# Altium schematic symbol library Analog Devices Data Converters Digital-to-Analog Converters.SchLib: 2231 symbols (part 95 of 135) (continued)
## AD7547JRZ-REEL (continued)

## AD7547KN
designator U?
Dual 12-Bit LC2MOS Digital-to-Analog Converter with Parallel Loading, 0 to +70 degC, N-24-1, Tube; Generic Part Number: AD7547; Manufacturer: Analog Devices; PartNumber: AD7547KN; # DAC Outputs: 2; Max V+: 16.5V; Op Pwr Diss: 30mW; Resolution (Bits): 12; Settling Time: 1.5µs; Single Supply: Yes; DatasheetVersion: Rev.A; PackageVersion: 071006-A; PackageReference: N-24-1; PackageDescription: 24-Lead Plastic Dual In-Line Package [PDIP] Narrow Body; Supplier 1: Digi-Key; Supplier Part Number 1: AD7547KN-ND; Supplier 2: Mouser; Supplier Part Number 2: 584-AD7547KN; Packing: Tube; RoHS: N; Mounting Technology: Through Hole; Code_JEDEC: MS-001; ComponentLink1Description: Manufacturer URL; ComponentLink1URL: http://www.analog.com/en/index.html; ComponentLink2Description: Datasheet; ComponentLink2URL: http://www.analog.com/static/imported-files/data_sheets/AD7547.pdf; ComponentLink3Description: Package Specification; ComponentLink3URL: http://www.analog.com/static/imported-files/packages/50726455539629N_24_1.pdf; ComponentLink4Description: Product URL; ComponentLink4URL: http://www.analog.com/en/digital-to-analog-converters/da-converters/ad7547/products/product.html
footprint N-24-1 (DIP, 24-Leads, Row Spacing 7.62mm, Pitch 2.54mm, Body 31.9x6.6mm)
pins: 1 AGND (power) "Analog Ground.", 2 IOUTA (out) "Current output terminal of DACA.", 3 RFBA (in) "Feedback resistor for DACA.", 4 VREFA (in) "Reference input to DACA.", 5 ~{CSA} (in) "Chip Select Input for DACA. Active low.", 6 DB0(LSB) (in) "Data input.", 7 DB1 (in) "Data input.", 8 DB2 (in) "Data input.", 9 DB3 (in) "Data input.", 10 DB4 (in) "Data input.", 11 DB5 (in) "Data input.", 12 DGND (power) "Digital Ground.", 13 DB6 (in) "Data input.", 14 DB7 (in) "Data input.", 15 DB8 (in) "Data input.", 16 DB9 (in) "Data input.", 17 DB10 (in) "Data input.", 18 DB11(MSB) (in) "Data input.", 19 ~{WR} (in) "Write Input. Data transfer occurs on rising edge of W\R\. See Table I.", 20 ~{CSB} (in) "Chip Select Input for DACB. Active low.", 21 VDD (power) "Power supply input. Norminally +12V to +15V with + / - 10% tolerance.", 22 VREFB (in) "Reference input to DACB.", 23 RFBB (in) "Feedback resistor of DACB.", 24 IOUTB (out) "Current output terminal of DACB."

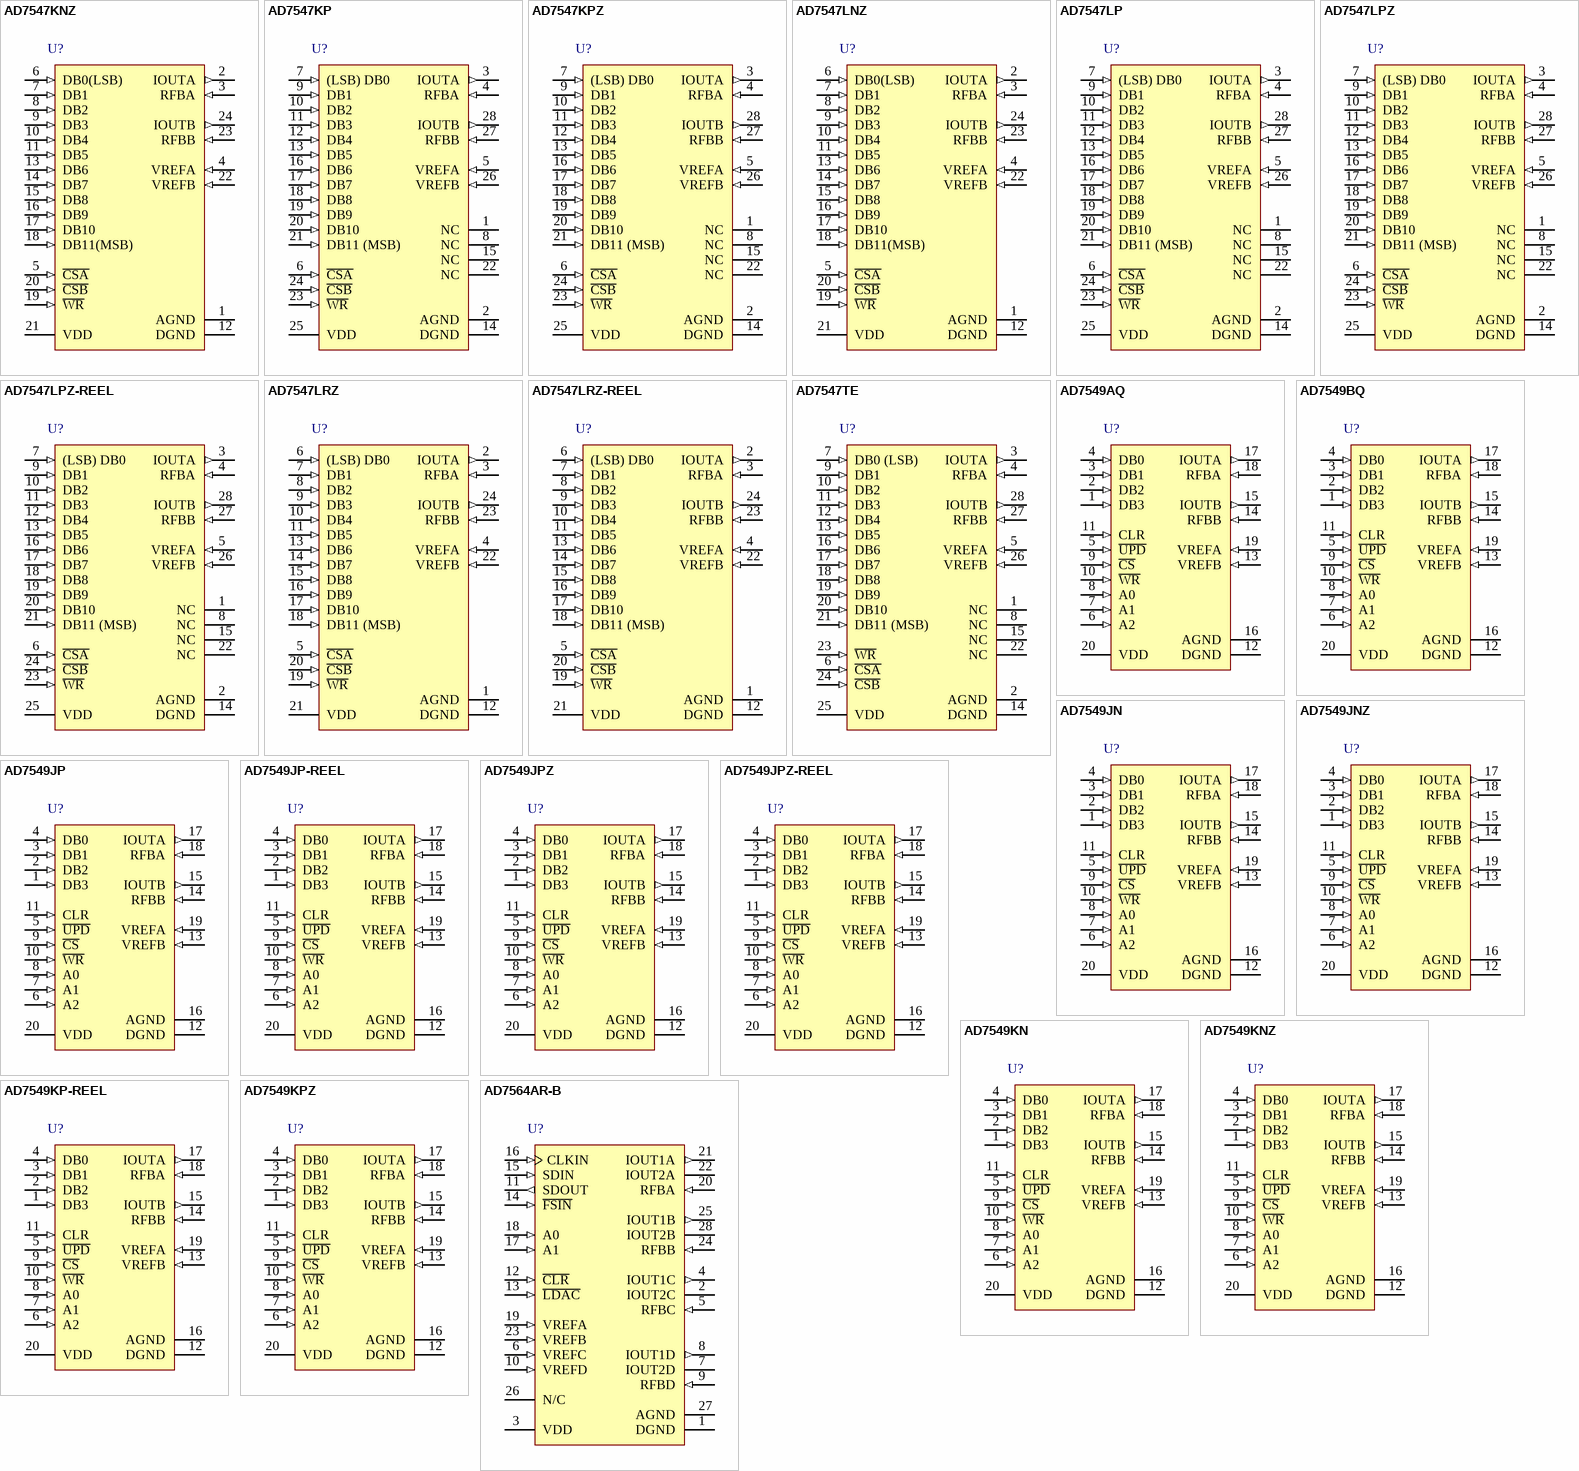
[diagram p70: symbols AD7547KNZ to AD7564AR-B]

## AD7547KNZ
designator U?
Dual 12-Bit LC2MOS Digital-to-Analog Converter with Parallel Loading, 0 to +70 degC, N-24-1, Pb-Free, Tube; Generic Part Number: AD7547; Manufacturer: Analog Devices; PartNumber: AD7547KNZ; # DAC Outputs: 2; Max V+: 16.5V; Op Pwr Diss: 30mW; Resolution (Bits): 12; Settling Time: 1.5µs; Single Supply: Yes; DatasheetVersion: Rev.A; PackageVersion: 071006-A; PackageReference: N-24-1; PackageDescription: 24-Lead Plastic Dual In-Line Package [PDIP] Narrow Body; Supplier 1: Digi-Key; Supplier Part Number 1: AD7547KNZ-ND; Supplier 2: Newark; Supplier Part Number 2: 59K5033; Supplier 3: Mouser; Supplier Part Number 3: 584-AD7547KNZ; Packing: Tube; RoHS: Y; Mounting Technology: Through Hole; Code_JEDEC: MS-001; ComponentLink1Description: Manufacturer URL; ComponentLink1URL: http://www.analog.com/en/index.html; ComponentLink2Description: Datasheet; ComponentLink2URL: http://www.analog.com/static/imported-files/data_sheets/AD7547.pdf; ComponentLink3Description: Package Specification; ComponentLink3URL: http://www.analog.com/static/imported-files/packages/50726455539629N_24_1.pdf; ComponentLink4Description: Product URL; ComponentLink4URL: http://www.analog.com/en/digital-to-analog-converters/da-converters/ad7547/products/product.html
footprint N-24-1 (DIP, 24-Leads, Row Spacing 7.62mm, Pitch 2.54mm, Body 31.9x6.6mm)
pins: 1 AGND (power) "Analog Ground.", 2 IOUTA (out) "Current output terminal of DACA.", 3 RFBA (in) "Feedback resistor for DACA.", 4 VREFA (in) "Reference input to DACA.", 5 ~{CSA} (in) "Chip Select Input for DACA. Active low.", 6 DB0(LSB) (in) "Data input.", 7 DB1 (in) "Data input.", 8 DB2 (in) "Data input.", 9 DB3 (in) "Data input.", 10 DB4 (in) "Data input.", 11 DB5 (in) "Data input.", 12 DGND (power) "Digital Ground.", 13 DB6 (in) "Data input.", 14 DB7 (in) "Data input.", 15 DB8 (in) "Data input.", 16 DB9 (in) "Data input.", 17 DB10 (in) "Data input.", 18 DB11(MSB) (in) "Data input.", 19 ~{WR} (in) "Write Input. Data transfer occurs on rising edge of W\R\. See Table I.", 20 ~{CSB} (in) "Chip Select Input for DACB. Active low.", 21 VDD (power) "Power supply input. Norminally +12V to +15V with + / - 10% tolerance.", 22 VREFB (in) "Reference input to DACB.", 23 RFBB (in) "Feedback resistor of DACB.", 24 IOUTB (out) "Current output terminal of DACB."

## AD7547KP
designator U?
Dual 12-Bit LC2MOS Digital-to-Analog Converter with Parallel Loading, 0 to +70 degC, P-28, Tube; Generic Part Number: AD7547; Manufacturer: Analog Devices; PartNumber: AD7547KP; # DAC Outputs: 2; Max V+: 16.5V; Op Pwr Diss: 30mW; Resolution (Bits): 12; Settling Time: 1.5µs; Single Supply: Yes; DatasheetVersion: Rev.A; PackageVersion: 042508-A; PackageReference: P-28; PackageDescription: 28-Lead Plastic Leaded Chip Carrier [PLCC]; Supplier 1: Digi-Key; Supplier Part Number 1: AD7547KP-ND; Supplier 2: Mouser; Supplier Part Number 2: 584-AD7547KP; Packing: Tube; RoHS: N; Mounting Technology: Surface Mount; Code_JEDEC: MO-047-AB; ComponentLink1Description: Manufacturer URL; ComponentLink1URL: http://www.analog.com/en/index.html; ComponentLink2Description: Datasheet; ComponentLink2URL: http://www.analog.com/static/imported-files/data_sheets/AD7547.pdf; ComponentLink3Description: Package Specification; ComponentLink3URL: http://www.analog.com/static/imported-files/packages/PKG_PDF/PLCC(P)/P_28.pdf; ComponentLink4Description: Product URL; ComponentLink4URL: http://www.analog.com/en/digital-to-analog-converters/da-converters/ad7547/products/product.html
footprint P-28_N (Leaded Chip Carrier, 28-Leads, Body 11.5x11.5mm, Pitch 1.27mm, IPC Medium Density)
footprint P-28_L (Leaded Chip Carrier, 28-Leads, Body 11.5x11.5mm, Pitch 1.27mm, IPC High Density)
footprint P-28_M (Leaded Chip Carrier, 28-Leads, Body 11.5x11.5mm, Pitch 1.27mm, IPC Low Density)
pins: 1 NC, 2 AGND (power), 3 IOUTA (out), 4 RFBA (in), 5 VREFA (in), 6 ~{CSA} (in), 7 (LSB) DB0 (in), 8 NC, 9 DB1 (in), 10 DB2 (in), 11 DB3 (in), 12 DB4 (in), 13 DB5 (in), 14 DGND (power), 15 NC, 16 DB6 (in), 17 DB7 (in), 18 DB8 (in), 19 DB9 (in), 20 DB10 (in), 21 DB11 (MSB) (in), 22 NC, 23 ~{WR} (in), 24 ~{CSB} (in), 25 VDD (power), 26 VREFB (in), 27 RFBB (in), 28 IOUTB (out)

## AD7547KPZ
designator U?
Dual 12-Bit LC2MOS Digital-to-Analog Converter with Parallel Loading, 0 to +70 degC, P-28, Pb-Free, Tube; Generic Part Number: AD7547; Manufacturer: Analog Devices; PartNumber: AD7547KPZ; # DAC Outputs: 2; Max V+: 16.5V; Op Pwr Diss: 30mW; Resolution (Bits): 12; Settling Time: 1.5µs; Single Supply: Yes; DatasheetVersion: Rev.A; PackageVersion: 042508-A; PackageReference: P-28; PackageDescription: 28-Lead Plastic Leaded Chip Carrier [PLCC]; Supplier 1: Digi-Key; Supplier Part Number 1: AD7547KPZ-ND; Supplier 2: Mouser; Supplier Part Number 2: 584-AD7547KPZ; Packing: Tube; RoHS: Y; Mounting Technology: Surface Mount; Code_JEDEC: MO-047-AB; ComponentLink1Description: Manufacturer URL; ComponentLink1URL: http://www.analog.com/en/index.html; ComponentLink2Description: Datasheet; ComponentLink2URL: http://www.analog.com/static/imported-files/data_sheets/AD7547.pdf; ComponentLink3Description: Package Specification; ComponentLink3URL: http://www.analog.com/static/imported-files/packages/PKG_PDF/PLCC(P)/P_28.pdf; ComponentLink4Description: Product URL; ComponentLink4URL: http://www.analog.com/en/digital-to-analog-converters/da-converters/ad7547/products/product.html
footprint P-28_N (Leaded Chip Carrier, 28-Leads, Body 11.5x11.5mm, Pitch 1.27mm, IPC Medium Density)
footprint P-28_L (Leaded Chip Carrier, 28-Leads, Body 11.5x11.5mm, Pitch 1.27mm, IPC High Density)
footprint P-28_M (Leaded Chip Carrier, 28-Leads, Body 11.5x11.5mm, Pitch 1.27mm, IPC Low Density)
pins: 1 NC, 2 AGND (power), 3 IOUTA (out), 4 RFBA (in), 5 VREFA (in), 6 ~{CSA} (in), 7 (LSB) DB0 (in), 8 NC, 9 DB1 (in), 10 DB2 (in), 11 DB3 (in), 12 DB4 (in), 13 DB5 (in), 14 DGND (power), 15 NC, 16 DB6 (in), 17 DB7 (in), 18 DB8 (in), 19 DB9 (in), 20 DB10 (in), 21 DB11 (MSB) (in), 22 NC, 23 ~{WR} (in), 24 ~{CSB} (in), 25 VDD (power), 26 VREFB (in), 27 RFBB (in), 28 IOUTB (out)

## AD7547LNZ
designator U?
Dual 12-Bit LC2MOS Digital-to-Analog Converter with Parallel Loading, 0 to +70 degC, N-24-1, Pb-Free, Tube; Generic Part Number: AD7547; Manufacturer: Analog Devices; PartNumber: AD7547LNZ; # DAC Outputs: 2; Max V+: 16.5V; Op Pwr Diss: 30mW; Resolution (Bits): 12; Settling Time: 1.5µs; Single Supply: Yes; DatasheetVersion: Rev.A; PackageVersion: 071006-A; PackageReference: N-24-1; PackageDescription: 24-Lead Plastic Dual In-Line Package [PDIP] Narrow Body; Supplier 1: Digi-Key; Supplier Part Number 1: AD7547LNZ-ND; Supplier 2: Mouser; Supplier Part Number 2: 584-AD7547LNZ; Packing: Tube; RoHS: Y; Mounting Technology: Through Hole; Code_JEDEC: MS-001; ComponentLink1Description: Manufacturer URL; ComponentLink1URL: http://www.analog.com/en/index.html; ComponentLink2Description: Datasheet; ComponentLink2URL: http://www.analog.com/static/imported-files/data_sheets/AD7547.pdf; ComponentLink3Description: Package Specification; ComponentLink3URL: http://www.analog.com/static/imported-files/packages/50726455539629N_24_1.pdf; ComponentLink4Description: Product URL; ComponentLink4URL: http://www.analog.com/en/digital-to-analog-converters/da-converters/ad7547/products/product.html
footprint N-24-1 (DIP, 24-Leads, Row Spacing 7.62mm, Pitch 2.54mm, Body 31.9x6.6mm)
pins: 1 AGND (power) "Analog Ground.", 2 IOUTA (out) "Current output terminal of DACA.", 3 RFBA (in) "Feedback resistor for DACA.", 4 VREFA (in) "Reference input to DACA.", 5 ~{CSA} (in) "Chip Select Input for DACA. Active low.", 6 DB0(LSB) (in) "Data input.", 7 DB1 (in) "Data input.", 8 DB2 (in) "Data input.", 9 DB3 (in) "Data input.", 10 DB4 (in) "Data input.", 11 DB5 (in) "Data input.", 12 DGND (power) "Digital Ground.", 13 DB6 (in) "Data input.", 14 DB7 (in) "Data input.", 15 DB8 (in) "Data input.", 16 DB9 (in) "Data input.", 17 DB10 (in) "Data input.", 18 DB11(MSB) (in) "Data input.", 19 ~{WR} (in) "Write Input. Data transfer occurs on rising edge of W\R\. See Table I.", 20 ~{CSB} (in) "Chip Select Input for DACB. Active low.", 21 VDD (power) "Power supply input. Norminally +12V to +15V with + / - 10% tolerance.", 22 VREFB (in) "Reference input to DACB.", 23 RFBB (in) "Feedback resistor of DACB.", 24 IOUTB (out) "Current output terminal of DACB."

## AD7547LP
designator U?
Dual 12-Bit LC2MOS Digital-to-Analog Converter with Parallel Loading, 0 to +70 degC, P-28, Tube; Generic Part Number: AD7547; Manufacturer: Analog Devices; PartNumber: AD7547LP; # DAC Outputs: 2; Max V+: 16.5V; Op Pwr Diss: 30mW; Resolution (Bits): 12; Settling Time: 1.5µs; Single Supply: Yes; DatasheetVersion: Rev.A; PackageVersion: 042508-A; PackageReference: P-28; PackageDescription: 28-Lead Plastic Leaded Chip Carrier [PLCC]; Supplier 1: Digi-Key; Supplier Part Number 1: AD7547LP-ND; Supplier 2: Mouser; Supplier Part Number 2: 584-AD7547LP; Packing: Tube; RoHS: N; Mounting Technology: Surface Mount; Code_JEDEC: MO-047-AB; ComponentLink1Description: Manufacturer URL; ComponentLink1URL: http://www.analog.com/en/index.html; ComponentLink2Description: Datasheet; ComponentLink2URL: http://www.analog.com/static/imported-files/data_sheets/AD7547.pdf; ComponentLink3Description: Package Specification; ComponentLink3URL: http://www.analog.com/static/imported-files/packages/PKG_PDF/PLCC(P)/P_28.pdf; ComponentLink4Description: Product URL; ComponentLink4URL: http://www.analog.com/en/digital-to-analog-converters/da-converters/ad7547/products/product.html
footprint P-28_N (Leaded Chip Carrier, 28-Leads, Body 11.5x11.5mm, Pitch 1.27mm, IPC Medium Density)
footprint P-28_L (Leaded Chip Carrier, 28-Leads, Body 11.5x11.5mm, Pitch 1.27mm, IPC High Density)
footprint P-28_M (Leaded Chip Carrier, 28-Leads, Body 11.5x11.5mm, Pitch 1.27mm, IPC Low Density)
pins: 1 NC, 2 AGND (power), 3 IOUTA (out), 4 RFBA (in), 5 VREFA (in), 6 ~{CSA} (in), 7 (LSB) DB0 (in), 8 NC, 9 DB1 (in), 10 DB2 (in), 11 DB3 (in), 12 DB4 (in), 13 DB5 (in), 14 DGND (power), 15 NC, 16 DB6 (in), 17 DB7 (in), 18 DB8 (in), 19 DB9 (in), 20 DB10 (in), 21 DB11 (MSB) (in), 22 NC, 23 ~{WR} (in), 24 ~{CSB} (in), 25 VDD (power), 26 VREFB (in), 27 RFBB (in), 28 IOUTB (out)

## AD7547LPZ
designator U?
Dual 12-Bit LC2MOS Digital-to-Analog Converter with Parallel Loading, 0 to +70 degC, P-28, Pb-Free, Tube; Generic Part Number: AD7547; Manufacturer: Analog Devices; PartNumber: AD7547LPZ; # DAC Outputs: 2; Max V+: 16.5V; Op Pwr Diss: 30mW; Resolution (Bits): 12; Settling Time: 1.5µs; Single Supply: Yes; DatasheetVersion: Rev.A; PackageVersion: 042508-A; PackageReference: P-28; PackageDescription: 28-Lead Plastic Leaded Chip Carrier [PLCC]; Supplier 1: Digi-Key; Supplier Part Number 1: AD7547LPZ-ND; Supplier 2: Mouser; Supplier Part Number 2: 584-AD7547LPZ; Packing: Tube; RoHS: Y; Mounting Technology: Surface Mount; Code_JEDEC: MO-047-AB; ComponentLink1Description: Manufacturer URL; ComponentLink1URL: http://www.analog.com/en/index.html; ComponentLink2Description: Datasheet; ComponentLink2URL: http://www.analog.com/static/imported-files/data_sheets/AD7547.pdf; ComponentLink3Description: Package Specification; ComponentLink3URL: http://www.analog.com/static/imported-files/packages/PKG_PDF/PLCC(P)/P_28.pdf; ComponentLink4Description: Product URL; ComponentLink4URL: http://www.analog.com/en/digital-to-analog-converters/da-converters/ad7547/products/product.html
footprint P-28_N (Leaded Chip Carrier, 28-Leads, Body 11.5x11.5mm, Pitch 1.27mm, IPC Medium Density)
footprint P-28_L (Leaded Chip Carrier, 28-Leads, Body 11.5x11.5mm, Pitch 1.27mm, IPC High Density)
footprint P-28_M (Leaded Chip Carrier, 28-Leads, Body 11.5x11.5mm, Pitch 1.27mm, IPC Low Density)
pins: 1 NC, 2 AGND (power), 3 IOUTA (out), 4 RFBA (in), 5 VREFA (in), 6 ~{CSA} (in), 7 (LSB) DB0 (in), 8 NC, 9 DB1 (in), 10 DB2 (in), 11 DB3 (in), 12 DB4 (in), 13 DB5 (in), 14 DGND (power), 15 NC, 16 DB6 (in), 17 DB7 (in), 18 DB8 (in), 19 DB9 (in), 20 DB10 (in), 21 DB11 (MSB) (in), 22 NC, 23 ~{WR} (in), 24 ~{CSB} (in), 25 VDD (power), 26 VREFB (in), 27 RFBB (in), 28 IOUTB (out)

## AD7547LPZ-REEL
designator U?
Dual 12-Bit LC2MOS Digital-to-Analog Converter with Parallel Loading, 0 to +70 degC, P-28, Pb-Free, Reel; Generic Part Number: AD7547; Manufacturer: Analog Devices; PartNumber: AD7547LPZ-REEL; # DAC Outputs: 2; Max V+: 16.5V; Op Pwr Diss: 30mW; Resolution (Bits): 12; Settling Time: 1.5µs; Single Supply: Yes; DatasheetVersion: Rev.A; PackageVersion: 042508-A; PackageReference: P-28; PackageDescription: 28-Lead Plastic Leaded Chip Carrier [PLCC]; Supplier 1: Digi-Key; Supplier Part Number 1: AD7547LPZ-REEL-ND; Supplier 2: Mouser; Supplier Part Number 2: 584-AD7547LPZ-R; Packing: Reel; RoHS: Y; Mounting Technology: Surface Mount; Code_JEDEC: MO-047-AB; ComponentLink1Description: Manufacturer URL; ComponentLink1URL: http://www.analog.com/en/index.html; ComponentLink2Description: Datasheet; ComponentLink2URL: http://www.analog.com/static/imported-files/data_sheets/AD7547.pdf; ComponentLink3Description: Package Specification; ComponentLink3URL: http://www.analog.com/static/imported-files/packages/PKG_PDF/PLCC(P)/P_28.pdf; ComponentLink4Description: Product URL; ComponentLink4URL: http://www.analog.com/en/digital-to-analog-converters/da-converters/ad7547/products/product.html
footprint P-28_N (Leaded Chip Carrier, 28-Leads, Body 11.5x11.5mm, Pitch 1.27mm, IPC Medium Density)
footprint P-28_L (Leaded Chip Carrier, 28-Leads, Body 11.5x11.5mm, Pitch 1.27mm, IPC High Density)
footprint P-28_M (Leaded Chip Carrier, 28-Leads, Body 11.5x11.5mm, Pitch 1.27mm, IPC Low Density)
pins: 1 NC, 2 AGND (power), 3 IOUTA (out), 4 RFBA (in), 5 VREFA (in), 6 ~{CSA} (in), 7 (LSB) DB0 (in), 8 NC, 9 DB1 (in), 10 DB2 (in), 11 DB3 (in), 12 DB4 (in), 13 DB5 (in), 14 DGND (power), 15 NC, 16 DB6 (in), 17 DB7 (in), 18 DB8 (in), 19 DB9 (in), 20 DB10 (in), 21 DB11 (MSB) (in), 22 NC, 23 ~{WR} (in), 24 ~{CSB} (in), 25 VDD (power), 26 VREFB (in), 27 RFBB (in), 28 IOUTB (out)

## AD7547LRZ
designator U?
Dual 12-Bit LC2MOS Digital-to-Analog Converter with Parallel Loading, 0 to +70 degC, RW-24, Pb-Free, Tube; Generic Part Number: AD7547; Manufacturer: Analog Devices; PartNumber: AD7547LRZ; # DAC Outputs: 2; Max V+: 16.5V; Op Pwr Diss: 30mW; Resolution (Bits): 12; Settling Time: 1.5µs; Single Supply: Yes; DatasheetVersion: Rev.A; PackageVersion: 060706-A; PackageReference: RW-24; PackageDescription: 24-Lead Standard Small Outline Package [SOIC_W]; Supplier 1: Digi-Key; Supplier Part Number 1: AD7547LRZ-ND; Supplier 2: Mouser; Supplier Part Number 2: 584-AD7547LRZ; Packing: Tube; RoHS: Y; Mounting Technology: Surface Mount; Code_JEDEC: MS-013-AD; ComponentLink1Description: Manufacturer URL; ComponentLink1URL: http://www.analog.com/en/index.html; ComponentLink2Description: Datasheet; ComponentLink2URL: http://www.analog.com/static/imported-files/data_sheets/AD7547.pdf; ComponentLink3Description: Package Specification; ComponentLink3URL: http://www.analog.com/static/imported-files/packages/33665150946139RW_24.pdf; ComponentLink4Description: Product URL; ComponentLink4URL: http://www.analog.com/en/digital-to-analog-converters/da-converters/ad7547/products/product.html
footprint RW-24_N (SOIC, 24-Leads, Body 15.4x7.5mm, Pitch 1.27mm, IPC Medium Density)
footprint RW-24_L (SOIC, 24-Leads, Body 15.4x7.5mm, Pitch 1.27mm, IPC High Density)
footprint RW-24_M (SOIC, 24-Leads, Body 15.4x7.5mm, Pitch 1.27mm, IPC Low Density)
pins: 1 AGND (power) "Analog Ground.", 2 IOUTA (out) "Current output terminal of DACA.", 3 RFBA (in) "Feedback resistor for DACA.", 4 VREFA (in) "Reference input to DACA.", 5 ~{CSA} (in) "Chip Select Input for DACA. Active low.", 6 (LSB) DB0 (in) "Data input.", 7 DB1 (in) "Data input.", 8 DB2 (in) "Data input.", 9 DB3 (in) "Data input.", 10 DB4 (in) "Data input.", 11 DB5 (in) "Data input.", 12 DGND (power) "Digital Ground.", 13 DB6 (in) "Data input.", 14 DB7 (in) "Data input.", 15 DB8 (in) "Data input.", 16 DB9 (in) "Data input.", 17 DB10 (in) "Data input.", 18 DB11 (MSB) (in) "Data input.", 19 ~{WR} (in) "Write Input. Data transfer occurs on rising edge of W\R\. See Table I.", 20 ~{CSB} (in) "Chip Select Input for DACB. Active low.", 21 VDD (power) "Power supply input. Nominally +12V to +15V with + / -10% tolerance.", 22 VREFB (in) "Reference input to DACB.", 23 RFBB (in) "Feedback resistor of DACB.", 24 IOUTB (out) "Current output terminal of DACB."

## AD7547LRZ-REEL
designator U?
Dual 12-Bit LC2MOS Digital-to-Analog Converter with Parallel Loading, 0 to +70 degC, RW-24, Pb-Free, Reel; Generic Part Number: AD7547; Manufacturer: Analog Devices; PartNumber: AD7547LRZ-REEL; # DAC Outputs: 2; Max V+: 16.5V; Op Pwr Diss: 30mW; Resolution (Bits): 12; Settling Time: 1.5µs; Single Supply: Yes; DatasheetVersion: Rev.A; PackageVersion: 060706-A; PackageReference: RW-24; PackageDescription: 24-Lead Standard Small Outline Package [SOIC_W]; Supplier 1: Digi-Key; Supplier Part Number 1: AD7547LRZ-REEL-ND; Supplier 2: Mouser; Supplier Part Number 2: 584-AD7547LRZ-R; Packing: Reel; RoHS: Y; Mounting Technology: Surface Mount; Code_JEDEC: MS-013-AD; ComponentLink1Description: Manufacturer URL; ComponentLink1URL: http://www.analog.com/en/index.html; ComponentLink2Description: Datasheet; ComponentLink2URL: http://www.analog.com/static/imported-files/data_sheets/AD7547.pdf; ComponentLink3Description: Package Specification; ComponentLink3URL: http://www.analog.com/static/imported-files/packages/33665150946139RW_24.pdf; ComponentLink4Description: Product URL; ComponentLink4URL: http://www.analog.com/en/digital-to-analog-converters/da-converters/ad7547/products/product.html
footprint RW-24_N (SOIC, 24-Leads, Body 15.4x7.5mm, Pitch 1.27mm, IPC Medium Density)
footprint RW-24_L (SOIC, 24-Leads, Body 15.4x7.5mm, Pitch 1.27mm, IPC High Density)
footprint RW-24_M (SOIC, 24-Leads, Body 15.4x7.5mm, Pitch 1.27mm, IPC Low Density)
pins: 1 AGND (power) "Analog Ground.", 2 IOUTA (out) "Current output terminal of DACA.", 3 RFBA (in) "Feedback resistor for DACA.", 4 VREFA (in) "Reference input to DACA.", 5 ~{CSA} (in) "Chip Select Input for DACA. Active low.", 6 (LSB) DB0 (in) "Data input.", 7 DB1 (in) "Data input.", 8 DB2 (in) "Data input.", 9 DB3 (in) "Data input.", 10 DB4 (in) "Data input.", 11 DB5 (in) "Data input.", 12 DGND (power) "Digital Ground.", 13 DB6 (in) "Data input.", 14 DB7 (in) "Data input.", 15 DB8 (in) "Data input.", 16 DB9 (in) "Data input.", 17 DB10 (in) "Data input.", 18 DB11 (MSB) (in) "Data input.", 19 ~{WR} (in) "Write Input. Data transfer occurs on rising edge of W\R\. See Table I.", 20 ~{CSB} (in) "Chip Select Input for DACB. Active low.", 21 VDD (power) "Power supply input. Nominally +12V to +15V with + / -10% tolerance.", 22 VREFB (in) "Reference input to DACB.", 23 RFBB (in) "Feedback resistor of DACB.", 24 IOUTB (out) "Current output terminal of DACB."

## AD7547TE
designator U?
Dual 12-Bit LC2MOS Digital-to-Analog Converter with Parallel Loading, -55 to +125 degC, E-28-1, Tube; Generic Part Number: AD7547; Manufacturer: Analog Devices; PartNumber: AD7547TE; # DAC Outputs: 2; Max V+: 16.5V; Op Pwr Diss: 30mW; Resolution (Bits): 12; Settling Time: 1.5µs; Single Supply: Yes; DatasheetVersion: Rev.A; PackageVersion: 022106-A; PackageReference: E-28-1; PackageDescription: 28-Terminal Ceramic Leadless Chip Carrier [LCC]; Supplier 1: Mouser; Supplier Part Number 1: N/A; Packing: Tube; RoHS: N; Mounting Technology: Surface Mount; ComponentLink1Description: Manufacturer URL; ComponentLink1URL: http://www.analog.com/en/index.html; ComponentLink2Description: Datasheet; ComponentLink2URL: http://www.analog.com/static/imported-files/data_sheets/AD7547.pdf; ComponentLink3Description: Package Specification; ComponentLink3URL: http://www.analog.com/static/imported-files/packages/PKG_PDF/LCC(E)/E_28_1.pdf; ComponentLink4Description: Product URL; ComponentLink4URL: http://www.analog.com/en/digital-to-analog-converters/da-converters/ad7547/products/product.html
footprint E-28-1_N (Leadless Chip Carrier, 28-Leads, Body 11.4x11.4mm, Pitch 1.27mm, IPC Medium Density)
footprint E-28-1_L (Leadless Chip Carrier, 28-Leads, Body 11.4x11.4mm, Pitch 1.27mm, IPC High Density)
footprint E-28-1_M (Leadless Chip Carrier, 28-Leads, Body 11.4x11.4mm, Pitch 1.27mm, IPC Low Density)
pins: 1 NC "No connect.", 2 AGND (power) "Analog Ground.", 3 IOUTA (out) "Current output terminal of DACA.", 4 RFBA (in) "Feedback resistor for DACA.", 5 VREFA (in) "Reference input to DACA.", 6 ~{CSA} (in) "Chip Select Input for DACA.Active low.", 7 DB0 (LSB) (in) "Data input.", 8 NC "No connect.", 9 DB1 (in) "Data input.", 10 DB2 (in) "Data input.", 11 DB3 (in) "Data input.", 12 DB4 (in) "Data input.", 13 DB5 (in) "Data input.", 14 DGND (power) "Digital Ground.", 15 NC "No connect.", 16 DB6 (in) "Data input.", 17 DB7 (in) "Data input.", 18 DB8 (in) "Data input.", 19 DB9 (in) "Data input.", 20 DB10 (in) "Data input.", 21 DB11 (MSB) (in) "Data input.", 22 NC "No connect.", 23 ~{WR} (in) "Write input.Data transfer occurs on rising edge of W\R\.", 24 ~{CSB} (in) "Chip Select Input for DACB.Active low.", 25 VDD (power) "Power supply input.Nominally +12V to +15V with +/- 10% tolerance.", 26 VREFB (in) "Reference input to DACB.", 27 RFBB (in) "Feedback resistor of DACB.", 28 IOUTB (out) "Current output terminal of DACB."

## AD7549AQ
designator U?
Dual 12-Bit uP-Compatible Digital-to-Analog Converter, -40 to +85 degC, Q-20, Tube; Generic Part Number: AD7549; Manufacturer: Analog Devices; PartNumber: AD7549AQ; # DAC Outputs: 2; Max V+: 15.75V; Op Pwr Diss: 75mW; Resolution (Bits): 12; Settling Time: 1.5µs; Single Supply: Yes; DatasheetVersion: Rev.A; PackageVersion: Dec-2004; PackageReference: Q-20; PackageDescription: 20-Lead Ceramic Dual In-Line Package [CERDIP]; Supplier 1: Digi-Key; Supplier Part Number 1: AD7549AQ-ND; Supplier 2: Mouser; Supplier Part Number 2: 584-AD7549AQ; Packing: Tube; RoHS: N; Mounting Technology: Through Hole; ComponentLink1Description: Manufacturer URL; ComponentLink1URL: http://www.analog.com/en/index.html; ComponentLink2Description: Datasheet; ComponentLink2URL: http://www.analog.com/static/imported-files/data_sheets/AD7549.pdf; ComponentLink3Description: Package Specification; ComponentLink3URL: http://www.analog.com/static/imported-files/packages/50516416473314Q_20.pdf; ComponentLink4Description: Product URL; ComponentLink4URL: http://www.analog.com/en/digital-to-analog-converters/da-converters/ad7549/products/product.html
footprint Q-20 (DIP, 20-Leads, Row Spacing 7.62mm, Pitch 2.54mm, Body 25.9x6.7mm)
pins: 1 DB3 (in) "Data Bit 3, Data Bit 7 or Data Bit 11(MSB)", 2 DB2 (in) "Data Bit 2, Data Bit 6 or Data Bit 10.", 3 DB1 (in) "Data Bit 1, Data Bit 5 or Data Bit 9.", 4 DB0 (in) "Data Bit 0, Data Bit 4 or Data Bit 8.", 5 ~{UPD} (in) "Updates DAC Registers from 4-bit input registers. DAC A and DAC B both updated simultaneously.", 6 A2 (in) "Address line 2.", 7 A1 (in) "Address line 1.", 8 A0 (in) "Address line 0.", 9 ~{CS} (in) "Chip Select Input. Active low.", 10 ~{WR} (in) "Write Input. Active low.", 11 CLR (in) "Clear Input. Active High. Clears all registers.", 12 DGND (power) "Digital Ground.", 13 VREFB (in) "Voltage reference input to DAC B.", 14 RFBB (in) "Feedback resistor of DAC B.", 15 IOUTB (out) "Current output terminal of DAC B.", 16 AGND (power) "Analog ground.", 17 IOUTA (out) "Current output terminal of DAC A.", 18 RFBA (in) "Feedback resistor of DAC A.", 19 VREFA (in) "Voltage reference input to DAC A.", 20 VDD (power) "+15 V supply input."

## AD7549BQ
designator U?
Dual 12-Bit uP-Compatible Digital-to-Analog Converter, -40 to +85 degC, Q-20, Tube; Generic Part Number: AD7549; Manufacturer: Analog Devices; PartNumber: AD7549BQ; # DAC Outputs: 2; Max V+: 15.75V; Op Pwr Diss: 75mW; Resolution (Bits): 12; Settling Time: 1.5µs; Single Supply: Yes; DatasheetVersion: Rev.A; PackageVersion: Dec-2004; PackageReference: Q-20; PackageDescription: 20-Lead Ceramic Dual In-Line Package [CERDIP]; Supplier 1: Digi-Key; Supplier Part Number 1: AD7549BQ-ND; Supplier 2: Mouser; Supplier Part Number 2: 584-AD7549BQ; Packing: Tube; RoHS: N; Mounting Technology: Through Hole; ComponentLink1Description: Manufacturer URL; ComponentLink1URL: http://www.analog.com/en/index.html; ComponentLink2Description: Datasheet; ComponentLink2URL: http://www.analog.com/static/imported-files/data_sheets/AD7549.pdf; ComponentLink3Description: Package Specification; ComponentLink3URL: http://www.analog.com/static/imported-files/packages/50516416473314Q_20.pdf; ComponentLink4Description: Product URL; ComponentLink4URL: http://www.analog.com/en/digital-to-analog-converters/da-converters/ad7549/products/product.html
footprint Q-20 (DIP, 20-Leads, Row Spacing 7.62mm, Pitch 2.54mm, Body 25.9x6.7mm)
pins: 1 DB3 (in) "Data Bit 3, Data Bit 7 or Data Bit 11(MSB)", 2 DB2 (in) "Data Bit 2, Data Bit 6 or Data Bit 10.", 3 DB1 (in) "Data Bit 1, Data Bit 5 or Data Bit 9.", 4 DB0 (in) "Data Bit 0, Data Bit 4 or Data Bit 8.", 5 ~{UPD} (in) "Updates DAC Registers from 4-bit input registers. DAC A and DAC B both updated simultaneously.", 6 A2 (in) "Address line 2.", 7 A1 (in) "Address line 1.", 8 A0 (in) "Address line 0.", 9 ~{CS} (in) "Chip Select Input. Active low.", 10 ~{WR} (in) "Write Input. Active low.", 11 CLR (in) "Clear Input. Active High. Clears all registers.", 12 DGND (power) "Digital Ground.", 13 VREFB (in) "Voltage reference input to DAC B.", 14 RFBB (in) "Feedback resistor of DAC B.", 15 IOUTB (out) "Current output terminal of DAC B.", 16 AGND (power) "Analog ground.", 17 IOUTA (out) "Current output terminal of DAC A.", 18 RFBA (in) "Feedback resistor of DAC A.", 19 VREFA (in) "Voltage reference input to DAC A.", 20 VDD (power) "+15 V supply input."

## AD7549JN
designator U?
Dual 12-Bit uP-Compatible Digital-to-Analog Converter, 0 to +70 degC, N-20, Tube; Generic Part Number: AD7549; Manufacturer: Analog Devices; PartNumber: AD7549JN; # DAC Outputs: 2; Max V+: 15.75V; Op Pwr Diss: 75mW; Resolution (Bits): 12; Settling Time: 1.5µs; Single Supply: Yes; DatasheetVersion: Rev.A; PackageVersion: 070706-A; PackageReference: N-20; PackageDescription: 20-Lead Plastic Dual In-Line Package [PDIP] Narrow Body; Supplier 1: Digi-Key; Supplier Part Number 1: AD7549JN-ND; Supplier 2: Mouser; Supplier Part Number 2: 584-AD7549JN; Packing: Tube; RoHS: N; Mounting Technology: Through Hole; Code_JEDEC: MS-001; ComponentLink1Description: Manufacturer URL; ComponentLink1URL: http://www.analog.com/en/index.html; ComponentLink2Description: Datasheet; ComponentLink2URL: http://www.analog.com/static/imported-files/data_sheets/AD7549.pdf; ComponentLink3Description: Package Specification; ComponentLink3URL: http://www.analog.com/static/imported-files/packages/50601349676519N_20.pdf; ComponentLink4Description: Product URL; ComponentLink4URL: http://www.analog.com/en/digital-to-analog-converters/da-converters/ad7549/products/product.html
footprint N-20 (DIP, 20-Leads, Row Spacing 7.62mm, Pitch 2.54mm, Body 25.9x6.6mm)
pins: 1 DB3 (in) "Data Bit 3,Data Bit 7 or Data Bit 11 (MSB)", 2 DB2 (in) "Data Bit 2,Data Bit 6 or Data Bit 10.", 3 DB1 (in) "Data Bit 1,Data Bit 5 or Data Bit 9.", 4 DB0 (in) "Data Bit 0,Data Bit 4 or Data Bit 8.", 5 ~{UPD} (in) "Updates DAC Registers from 4-bit input registers.DAC A and DAC B both updated simultaneously.", 6 A2 (in) "Address line 2.", 7 A1 (in) "Address line 1.", 8 A0 (in) "Address line 0.", 9 ~{CS} (in) "Chip Sekect Input.Active low.", 10 ~{WR} (in) "Write Input.Active low.", 11 CLR (in) "Clear Input.Active High.Clears all registers.", 12 DGND (power) "Digital Ground.", 13 VREFB (in) "Voltage reference input to DAC B.", 14 RFBB (in) "Feedback resistor of DAC B.", 15 IOUTB (out) "Current output terminal of DAC B.", 16 AGND (power) "Analog ground.", 17 IOUTA (out) "Current output terminal of DAC A.", 18 RFBA (in) "Feedback resistor of DAC A.", 19 VREFA (in) "Voltage reference input to DAC A.", 20 VDD (power) "+15 V supply input."

## AD7549JNZ
designator U?
Dual 12-Bit uP-Compatible Digital-to-Analog Converter, 0 to +70 degC, N-20, Pb-Free, Tube; Generic Part Number: AD7549; Manufacturer: Analog Devices; PartNumber: AD7549JNZ; # DAC Outputs: 2; Max V+: 15.75V; Op Pwr Diss: 75mW; Resolution (Bits): 12; Settling Time: 1.5µs; Single Supply: Yes; DatasheetVersion: Rev.A; PackageVersion: 070706-A; PackageReference: N-20; PackageDescription: 20-Lead Plastic Dual In-Line Package [PDIP] Narrow Body; Supplier 1: Digi-Key; Supplier Part Number 1: AD7549JNZ-ND; Supplier 2: Farnell; Supplier Part Number 2: 1079373; Supplier 3: Newark; Supplier Part Number 3: 59K5042; Supplier 4: Mouser; Supplier Part Number 4: 584-AD7549JNZ; Packing: Tube; RoHS: Y; Mounting Technology: Through Hole; Code_JEDEC: MS-001; ComponentLink1Description: Manufacturer URL; ComponentLink1URL: http://www.analog.com/en/index.html; ComponentLink2Description: Datasheet; ComponentLink2URL: http://www.analog.com/static/imported-files/data_sheets/AD7549.pdf; ComponentLink3Description: Package Specification; ComponentLink3URL: http://www.analog.com/static/imported-files/packages/50601349676519N_20.pdf; ComponentLink4Description: Product URL; ComponentLink4URL: http://www.analog.com/en/digital-to-analog-converters/da-converters/ad7549/products/product.html
footprint N-20 (DIP, 20-Leads, Row Spacing 7.62mm, Pitch 2.54mm, Body 25.9x6.6mm)
pins: 1 DB3 (in) "Data Bit 3,Data Bit 7 or Data Bit 11 (MSB)", 2 DB2 (in) "Data Bit 2,Data Bit 6 or Data Bit 10.", 3 DB1 (in) "Data Bit 1,Data Bit 5 or Data Bit 9.", 4 DB0 (in) "Data Bit 0,Data Bit 4 or Data Bit 8.", 5 ~{UPD} (in) "Updates DAC Registers from 4-bit input registers.DAC A and DAC B both updated simultaneously.", 6 A2 (in) "Address line 2.", 7 A1 (in) "Address line 1.", 8 A0 (in) "Address line 0.", 9 ~{CS} (in) "Chip Sekect Input.Active low.", 10 ~{WR} (in) "Write Input.Active low.", 11 CLR (in) "Clear Input.Active High.Clears all registers.", 12 DGND (power) "Digital Ground.", 13 VREFB (in) "Voltage reference input to DAC B.", 14 RFBB (in) "Feedback resistor of DAC B.", 15 IOUTB (out) "Current output terminal of DAC B.", 16 AGND (power) "Analog ground.", 17 IOUTA (out) "Current output terminal of DAC A.", 18 RFBA (in) "Feedback resistor of DAC A.", 19 VREFA (in) "Voltage reference input to DAC A.", 20 VDD (power) "+15 V supply input."

## AD7549JP
designator U?
Dual 12-Bit uP-Compatible Digital-to-Analog Converter, 0 to +70 degC, P-20A, Tube; Generic Part Number: AD7549; Manufacturer: Analog Devices; PartNumber: AD7549JP; # DAC Outputs: 2; Max V+: 15.75V; Op Pwr Diss: 75mW; Resolution (Bits): 12; Settling Time: 1.5µs; Single Supply: Yes; DatasheetVersion: Rev.A; PackageVersion: Nov-2002; PackageReference: P-20A; PackageDescription: 20-Lead Plastic Leaded Chip Carrier [PLCC]; Supplier 1: Digi-Key; Supplier Part Number 1: AD7549JP-ND; Supplier 2: Mouser; Supplier Part Number 2: 584-AD7549JP; Packing: Tube; RoHS: N; Mounting Technology: Surface Mount; Code_JEDEC: MO-047-AA; ComponentLink1Description: Manufacturer URL; ComponentLink1URL: http://www.analog.com/en/index.html; ComponentLink2Description: Datasheet; ComponentLink2URL: http://www.analog.com/static/imported-files/data_sheets/AD7549.pdf; ComponentLink3Description: Package Specification; ComponentLink3URL: http://www.analog.com/static/imported-files/packages/3121431516544404277643669223804694P20A.pdf; ComponentLink4Description: Product URL; ComponentLink4URL: http://www.analog.com/en/digital-to-analog-converters/da-converters/ad7549/products/product.html
footprint P-20A_N (Leaded Chip Carrier, 20-Leads, Body 9x9mm, Pitch 1.27mm, IPC Medium Density)
footprint P-20A_L (Leaded Chip Carrier, 20-Leads, Body 9x9mm, Pitch 1.27mm, IPC High Density)
footprint P-20A_M (Leaded Chip Carrier, 20-Leads, Body 9x9mm, Pitch 1.27mm, IPC Low Density)
pins: 1 DB3 (in) "Data Bit 3, Data Bit 7 or Data Bit 11(MSB)", 2 DB2 (in) "Data Bit 2, Data Bit 6 or Data Bit 10.", 3 DB1 (in) "Data Bit 1, Data Bit 5 or Data Bit 9.", 4 DB0 (in) "Data Bit 0, Data Bit 4 or Data Bit 8.", 5 ~{UPD} (in) "Updates DAC Registers from 4-bit input registers. DAC A and DAC B both updated simultaneously.", 6 A2 (in) "Address line 2.", 7 A1 (in) "Address line 1.", 8 A0 (in) "Address line 0.", 9 ~{CS} (in) "Chip Select Input. Active low.", 10 ~{WR} (in) "Write Input. Active low.", 11 CLR (in) "Clear Input. Active High. Clears all registers.", 12 DGND (power) "Digital Ground.", 13 VREFB (in) "Voltage reference input to DAC B.", 14 RFBB (in) "Feedback resistor of DAC B.", 15 IOUTB (out) "Current output terminal of DAC B.", 16 AGND (power) "Analog ground.", 17 IOUTA (out) "Current output terminal of DAC A.", 18 RFBA (in) "Feedback resistor of DAC A.", 19 VREFA (in) "Voltage reference input to DAC A.", 20 VDD (power) "+15 V supply input."

## AD7549JP-REEL
designator U?
Dual 12-Bit uP-Compatible Digital-to-Analog Converter, 0 to +70 degC, P-20A, Reel; Generic Part Number: AD7549; Manufacturer: Analog Devices; PartNumber: AD7549JP-REEL; # DAC Outputs: 2; Max V+: 15.75V; Op Pwr Diss: 75mW; Resolution (Bits): 12; Settling Time: 1.5µs; Single Supply: Yes; DatasheetVersion: Rev.A; PackageVersion: Nov-2002; PackageReference: P-20A; PackageDescription: 20-Lead Plastic Leaded Chip Carrier [PLCC]; Supplier 1: Mouser; Supplier Part Number 1: N/A; Packing: Reel; RoHS: N; Mounting Technology: Surface Mount; Code_JEDEC: MO-047-AA; ComponentLink1Description: Manufacturer URL; ComponentLink1URL: http://www.analog.com/en/index.html; ComponentLink2Description: Datasheet; ComponentLink2URL: http://www.analog.com/static/imported-files/data_sheets/AD7549.pdf; ComponentLink3Description: Package Specification; ComponentLink3URL: http://www.analog.com/static/imported-files/packages/3121431516544404277643669223804694P20A.pdf; ComponentLink4Description: Product URL; ComponentLink4URL: http://www.analog.com/en/digital-to-analog-converters/da-converters/ad7549/products/product.html
footprint P-20A_N (Leaded Chip Carrier, 20-Leads, Body 9x9mm, Pitch 1.27mm, IPC Medium Density)
footprint P-20A_L (Leaded Chip Carrier, 20-Leads, Body 9x9mm, Pitch 1.27mm, IPC High Density)
footprint P-20A_M (Leaded Chip Carrier, 20-Leads, Body 9x9mm, Pitch 1.27mm, IPC Low Density)
pins: 1 DB3 (in) "Data Bit 3, Data Bit 7 or Data Bit 11(MSB)", 2 DB2 (in) "Data Bit 2, Data Bit 6 or Data Bit 10.", 3 DB1 (in) "Data Bit 1, Data Bit 5 or Data Bit 9.", 4 DB0 (in) "Data Bit 0, Data Bit 4 or Data Bit 8.", 5 ~{UPD} (in) "Updates DAC Registers from 4-bit input registers. DAC A and DAC B both updated simultaneously.", 6 A2 (in) "Address line 2.", 7 A1 (in) "Address line 1.", 8 A0 (in) "Address line 0.", 9 ~{CS} (in) "Chip Select Input. Active low.", 10 ~{WR} (in) "Write Input. Active low.", 11 CLR (in) "Clear Input. Active High. Clears all registers.", 12 DGND (power) "Digital Ground.", 13 VREFB (in) "Voltage reference input to DAC B.", 14 RFBB (in) "Feedback resistor of DAC B.", 15 IOUTB (out) "Current output terminal of DAC B.", 16 AGND (power) "Analog ground.", 17 IOUTA (out) "Current output terminal of DAC A.", 18 RFBA (in) "Feedback resistor of DAC A.", 19 VREFA (in) "Voltage reference input to DAC A.", 20 VDD (power) "+15 V supply input."

## AD7549JPZ
designator U?
Dual 12-Bit uP-Compatible Digital-to-Analog Converter, 0 to +70 degC, P-20A, Pb-Free, Tube; Generic Part Number: AD7549; Manufacturer: Analog Devices; PartNumber: AD7549JPZ; # DAC Outputs: 2; Max V+: 15.75V; Op Pwr Diss: 75mW; Resolution (Bits): 12; Settling Time: 1.5µs; Single Supply: Yes; DatasheetVersion: Rev.A; PackageVersion: Nov-2002; PackageReference: P-20A; PackageDescription: 20-Lead Plastic Leaded Chip Carrier [PLCC]; Supplier 1: Digi-Key; Supplier Part Number 1: AD7549JPZ-ND; Supplier 2: Newark; Supplier Part Number 2: 59K5043; Supplier 3: Mouser; Supplier Part Number 3: 584-AD7549JPZ; Packing: Tube; RoHS: Y; Mounting Technology: Surface Mount; Code_JEDEC: MO-047-AA; ComponentLink1Description: Manufacturer URL; ComponentLink1URL: http://www.analog.com/en/index.html; ComponentLink2Description: Datasheet; ComponentLink2URL: http://www.analog.com/static/imported-files/data_sheets/AD7549.pdf; ComponentLink3Description: Package Specification; ComponentLink3URL: http://www.analog.com/static/imported-files/packages/3121431516544404277643669223804694P20A.pdf; ComponentLink4Description: Product URL; ComponentLink4URL: http://www.analog.com/en/digital-to-analog-converters/da-converters/ad7549/products/product.html
footprint P-20A_N (Leaded Chip Carrier, 20-Leads, Body 9x9mm, Pitch 1.27mm, IPC Medium Density)
footprint P-20A_L (Leaded Chip Carrier, 20-Leads, Body 9x9mm, Pitch 1.27mm, IPC High Density)
footprint P-20A_M (Leaded Chip Carrier, 20-Leads, Body 9x9mm, Pitch 1.27mm, IPC Low Density)
pins: 1 DB3 (in) "Data Bit 3, Data Bit 7 or Data Bit 11(MSB)", 2 DB2 (in) "Data Bit 2, Data Bit 6 or Data Bit 10.", 3 DB1 (in) "Data Bit 1, Data Bit 5 or Data Bit 9.", 4 DB0 (in) "Data Bit 0, Data Bit 4 or Data Bit 8.", 5 ~{UPD} (in) "Updates DAC Registers from 4-bit input registers. DAC A and DAC B both updated simultaneously.", 6 A2 (in) "Address line 2.", 7 A1 (in) "Address line 1.", 8 A0 (in) "Address line 0.", 9 ~{CS} (in) "Chip Select Input. Active low.", 10 ~{WR} (in) "Write Input. Active low.", 11 CLR (in) "Clear Input. Active High. Clears all registers.", 12 DGND (power) "Digital Ground.", 13 VREFB (in) "Voltage reference input to DAC B.", 14 RFBB (in) "Feedback resistor of DAC B.", 15 IOUTB (out) "Current output terminal of DAC B.", 16 AGND (power) "Analog ground.", 17 IOUTA (out) "Current output terminal of DAC A.", 18 RFBA (in) "Feedback resistor of DAC A.", 19 VREFA (in) "Voltage reference input to DAC A.", 20 VDD (power) "+15 V supply input."